# Altium footprint library HDR127P.PcbLib: 19 footprints (part 1 of 2)
Each footprint in its own frame and in the unit in brackets; x right, y up, seen from the top. Pads: shape width x height; smd on the part's side, far side on the other; paste and mask are expansions set on the pad; w line width, h text height; cw(c..) or ccw(c..) is an arc to the next point about the centre after c.
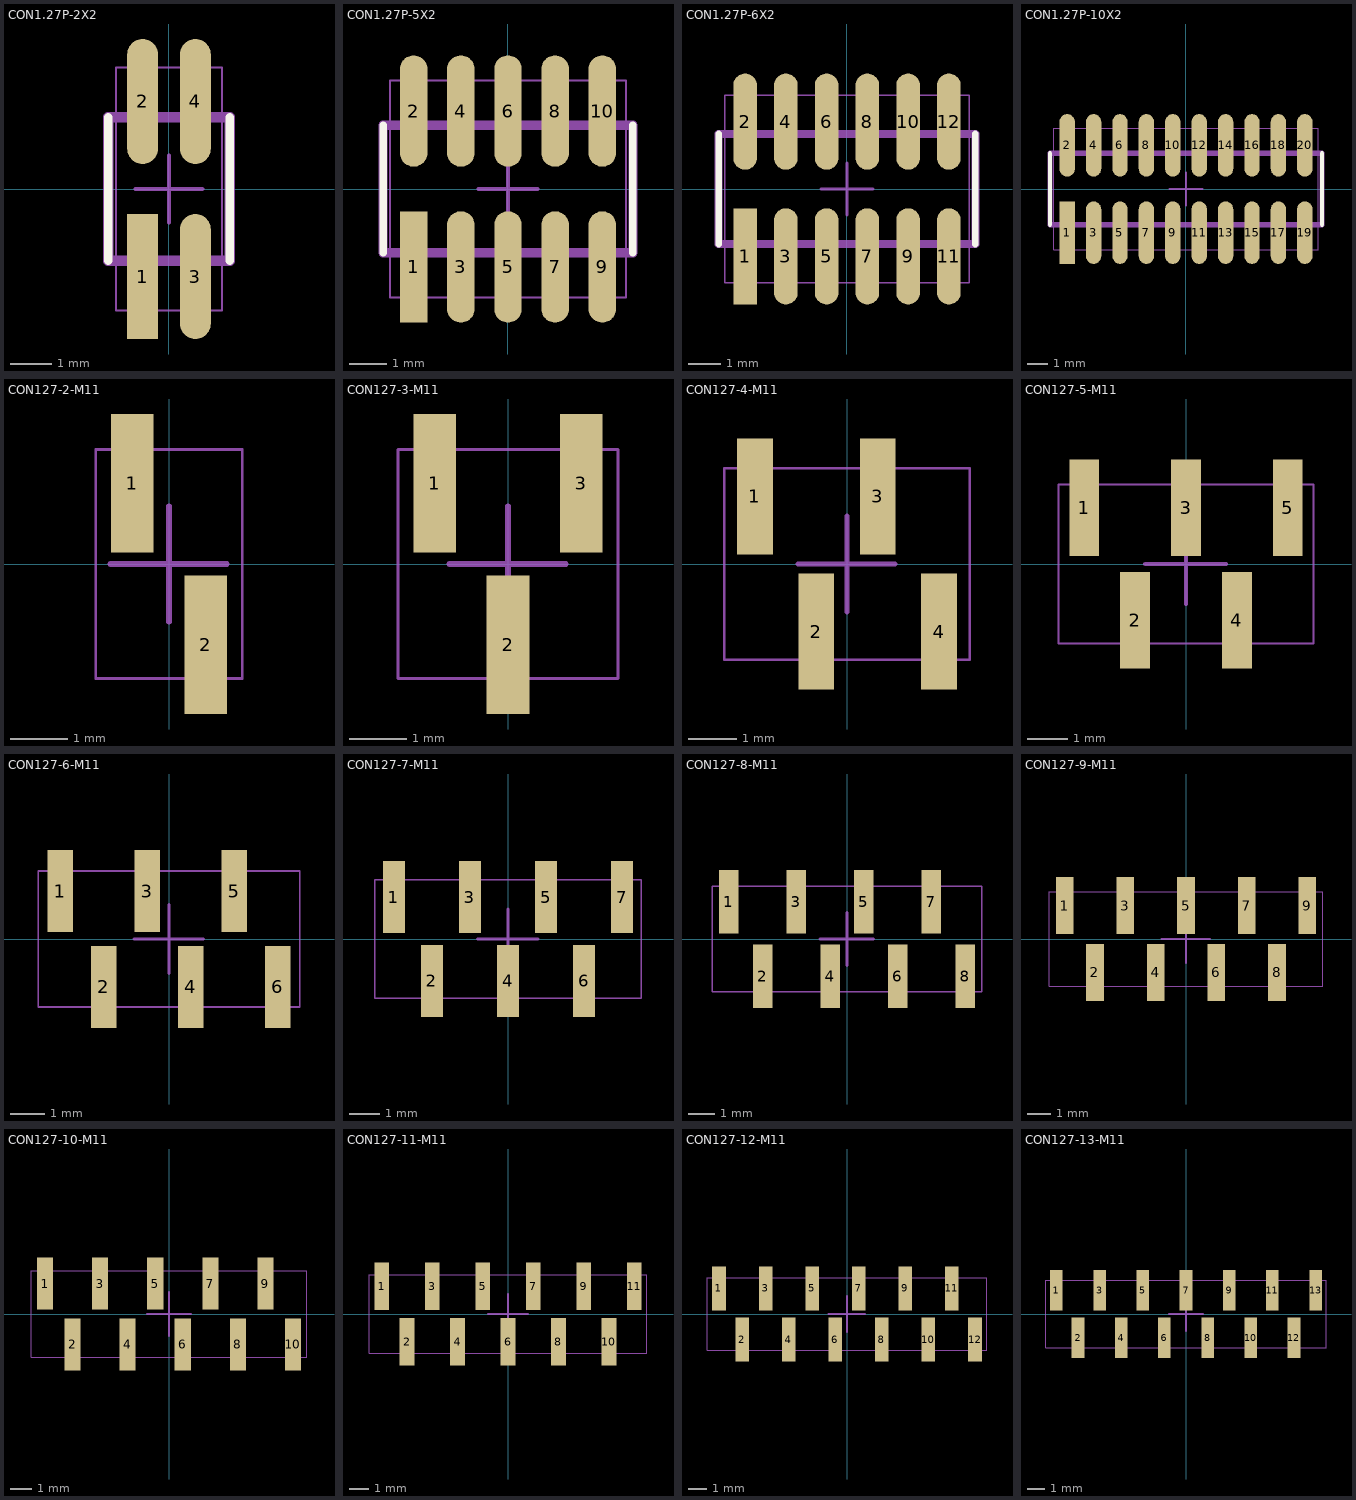
[diagram p0: the footprints below, top view; thin cyan lines are the x and y axes]

## CON1.27P-2X2 [mm] "贴片1.27X10X2脚排母"
height 3.4
pads (4):
  rect 0.74x3 smd: 1(-0.635,-2.1)
  oval 0.74x3 smd: 2(-0.635,2.1) 3(0.635,-2.1) 4(0.635,2.1)
Top Overlay:
  lines w0.2: -1.46,-1.72 -1.46,1.72 ; 1.46,-1.72 1.46,1.72
Mechanical 13:
  lines w0.05: -1.27,-2.921 -1.27,2.919 1.27,2.919 1.27,-2.921 -1.27,-2.921
Mechanical 15:
  lines w0.1: -0.8,0 0.8,0 ; 0,-0.8 0,0.8
  lines w0.25: -1.46,-1.72 1.46,-1.72 1.46,1.72 -1.46,1.72 -1.46,-1.72
3D body: height 4.9, standoff 0, extent -1.27,-2.92 1.27,2.92

## CON1.27P-5X2 [mm] "贴片1.27X10X2脚排母"
height 3.4
pads (10):
  rect 0.74x3 smd: 1(-2.54,-2.1)
  oval 0.74x3 smd: 2(-2.54,2.1) 3(-1.27,-2.1) 4(-1.27,2.1) 5(0,-2.1) 6(0,2.1) 7(1.27,-2.1) 8(1.27,2.1) 9(2.54,-2.1) 10(2.54,2.1)
Top Overlay:
  lines w0.2: -3.365,-1.72 -3.365,1.72 ; 3.365,-1.72 3.365,1.72
Mechanical 13:
  lines w0.05: -3.175,-2.921 -3.175,2.919 3.175,2.919 3.175,-2.921 -3.175,-2.921
Mechanical 15:
  lines w0.1: -0.8,0 0.8,0 ; 0,-0.8 0,0.8
  lines w0.25: -3.365,-1.72 3.365,-1.72 3.365,1.72 -3.365,1.72 -3.365,-1.72
3D body: height 4.9, standoff 0, extent -3.175,-2.92 3.175,2.92

## CON1.27P-6X2 [mm] "贴片1.27X10X2脚排母"
height 3.4
pads (12):
  rect 0.74x3 smd: 1(-3.175,-2.1)
  oval 0.74x3 smd: 2(-3.175,2.1) 3(-1.905,-2.1) 4(-1.905,2.1) 5(-0.635,-2.1) 6(-0.635,2.1) 7(0.635,-2.1) 8(0.635,2.1) 9(1.905,-2.1) 10(1.905,2.1) 11(3.175,-2.1) 12(3.175,2.1)
Top Overlay:
  lines w0.2: -4,-1.72 -4,1.72 ; 4,-1.72 4,1.72
Mechanical 13:
  lines w0.05: -3.81,-2.921 -3.81,2.919 3.81,2.919 3.81,-2.921 -3.81,-2.921
Mechanical 15:
  lines w0.1: -0.8,0 0.8,0 ; 0,-0.8 0,0.8
  lines w0.25: -4,-1.72 4,-1.72 4,1.72 -4,1.72 -4,-1.72
3D body: height 4.9, standoff 0, extent -3.81,-2.92 3.81,2.92

## CON1.27P-10X2 [mm] "贴片1.27X10X2脚排母"
height 3.4
pads (20):
  rect 0.74x3 smd: 1(-5.715,-2.1)
  oval 0.74x3 smd: 2(-5.715,2.1) 3(-4.445,-2.1) 4(-4.445,2.1) 5(-3.175,-2.1) 6(-3.175,2.1) 7(-1.905,-2.1) 8(-1.905,2.1) 9(-0.635,-2.1) 10(-0.635,2.1) 11(0.635,-2.1) 12(0.635,2.1) 13(1.905,-2.1) 14(1.905,2.1) 15(3.175,-2.1) 16(3.175,2.1) 17(4.445,-2.1) 18(4.445,2.1) 19(5.715,-2.1) 20(5.715,2.1)
Top Overlay:
  lines w0.2: -6.54,-1.72 -6.54,1.72 ; 6.54,-1.72 6.54,1.72
Mechanical 13:
  lines w0.05: -6.35,-2.921 6.35,-2.921 6.35,2.919 -6.35,2.919 -6.35,-2.921
Mechanical 15:
  lines w0.1: -0.8,0 0.8,0 ; 0,-0.8 0,0.8
  lines w0.25: -6.54,-1.72 -6.54,1.72 6.54,1.72 6.54,-1.72 -6.54,-1.72
3D body: height 4.9, standoff -0.9, extent -6.35,-2.921 6.35,2.919

## CON127-2-M11 [mm] "1.27mm脚距，排针。联益康电子"
height 5
pads (2):
  rect 0.74x2.4 smd: 1(-0.635,1.4) 2(0.635,-1.4)
Mechanical 13:
  lines w0.05: -1.27,-1.985 -1.27,1.985 1.27,1.985 1.27,-1.985 -1.27,-1.985
Mechanical 15:
  lines w0.1: -1.016,0 1,0 ; 0,-1 0,1
3D body: height 5.3, standoff 0.04, extent -1.27,-1.985 1.27,1.985

## CON127-3-M11 [mm] "1.27mm脚距，排针。联益康电子"
height 5
pads (3):
  rect 0.74x2.4 smd: 1(-1.27,1.4) 2(0,-1.4) 3(1.27,1.4)
Mechanical 13:
  lines w0.05: -1.905,-1.985 1.905,-1.985 1.905,1.985 -1.905,1.985 -1.905,-1.985
Mechanical 15:
  lines w0.1: -1.016,0 1,0 ; 0,-1 0,1
3D body: height 5.3, standoff 0.04, extent -1.905,-1.985 1.905,1.985

## CON127-4-M11 [mm] "1.27mm脚距，排针。联益康电子"
height 5
pads (4):
  rect 0.74x2.4 smd: 1(-1.905,1.4) 2(-0.635,-1.4) 3(0.635,1.4) 4(1.905,-1.4)
Mechanical 13:
  lines w0.05: -2.54,-1.985 2.54,-1.985 2.54,1.985 -2.54,1.985 -2.54,-1.985
Mechanical 15:
  lines w0.1: -1.016,0 1,0 ; 0,-1 0,1
3D body: height 5.3, standoff 0.04, extent -2.54,-1.985 2.54,1.985

## CON127-5-M11 [mm] "1.27mm脚距，排针。联益康电子"
height 5
pads (5):
  rect 0.74x2.4 smd: 1(-2.54,1.4) 2(-1.27,-1.4) 3(0,1.4) 4(1.27,-1.4) 5(2.54,1.4)
Mechanical 13:
  lines w0.05: -3.175,-1.985 -3.175,1.985 3.175,1.985 3.175,-1.985 -3.175,-1.985
Mechanical 15:
  lines w0.1: -1.016,0 1,0 ; 0,-1 0,1
3D body: height 5.3, standoff 0.04, extent -3.175,-1.985 3.175,1.985

## CON127-6-M11 [mm] "1.27mm脚距，排针。联益康电子"
height 5
pads (6):
  rect 0.74x2.4 smd: 1(-3.175,1.4) 2(-1.905,-1.4) 3(-0.635,1.4) 4(0.635,-1.4) 5(1.905,1.4) 6(3.175,-1.4)
Mechanical 13:
  lines w0.05: -3.81,-1.985 -3.81,1.985 3.81,1.985 3.81,-1.985 -3.81,-1.985
Mechanical 15:
  lines w0.1: -1.016,0 1,0 ; 0,-1 0,1
3D body: height 5.3, standoff 0.04, extent -3.81,-1.985 3.81,1.985

## CON127-7-M11 [mm] "1.27mm脚距，排针。联益康电子"
height 5
pads (7):
  rect 0.74x2.4 smd: 1(-3.81,1.4) 2(-2.54,-1.4) 3(-1.27,1.4) 4(0,-1.4) 5(1.27,1.4) 6(2.54,-1.4) 7(3.81,1.4)
Mechanical 13:
  lines w0.05: -4.445,-1.985 4.445,-1.985 4.445,1.985 -4.445,1.985 -4.445,-1.985
Mechanical 15:
  lines w0.1: -1.016,0 1,0 ; 0,-1 0,1
3D body: height 5.3, standoff 0.04, extent -4.445,-1.985 4.445,1.985

## CON127-8-M11 [mm] "1.27mm脚距，排针。联益康电子"
height 5
pads (8):
  rect 0.74x2.4 smd: 1(-4.445,1.4) 2(-3.175,-1.4) 3(-1.905,1.4) 4(-0.635,-1.4) 5(0.635,1.4) 6(1.905,-1.4) 7(3.175,1.4) 8(4.445,-1.4)
Mechanical 13:
  lines w0.05: -5.08,-1.985 5.08,-1.985 5.08,1.985 -5.08,1.985 -5.08,-1.985
Mechanical 15:
  lines w0.1: -1.016,0 1,0 ; 0,-1 0,1
3D body: height 5.3, standoff 0.04, extent -5.08,-1.985 5.08,1.985

## CON127-9-M11 [mm] "1.27mm脚距，排针。联益康电子"
height 5
pads (9):
  rect 0.74x2.4 smd: 1(-5.08,1.4) 2(-3.81,-1.4) 3(-2.54,1.4) 4(-1.27,-1.4) 5(0,1.4) 6(1.27,-1.4) 7(2.54,1.4) 8(3.81,-1.4) 9(5.08,1.4)
Mechanical 13:
  lines w0.05: -5.715,-1.985 5.715,-1.985 5.715,1.985 -5.715,1.985 -5.715,-1.985
Mechanical 15:
  lines w0.1: -1.016,0 1,0 ; 0,-1 0,1
3D body: height 5.3, standoff 0.04, extent -5.715,-1.985 5.715,1.985

## CON127-10-M11 [mm] "1.27mm脚距，排针。联益康电子"
height 5
pads (10):
  rect 0.74x2.4 smd: 1(-5.715,1.4) 2(-4.445,-1.4) 3(-3.175,1.4) 4(-1.905,-1.4) 5(-0.635,1.4) 6(0.635,-1.4) 7(1.905,1.4) 8(3.175,-1.4) 9(4.445,1.4) 10(5.715,-1.4)
Mechanical 13:
  lines w0.05: -6.35,-1.985 -6.35,1.985 6.35,1.985 6.35,-1.985 -6.35,-1.985
Mechanical 15:
  lines w0.1: -1.016,0 1,0 ; 0,-1 0,1
3D body: height 5.3, standoff 0.04, extent -6.35,-1.985 6.35,1.985

## CON127-11-M11 [mm] "1.27mm脚距，排针。联益康电子"
height 5
pads (11):
  rect 0.74x2.4 smd: 1(-6.35,1.4) 2(-5.08,-1.4) 3(-3.81,1.4) 4(-2.54,-1.4) 5(-1.27,1.4) 6(0,-1.4) 7(1.27,1.4) 8(2.54,-1.4) 9(3.81,1.4) 10(5.08,-1.4) 11(6.35,1.4)
Mechanical 13:
  lines w0.05: -6.985,-1.985 6.985,-1.985 6.985,1.985 -6.985,1.985 -6.985,-1.985
Mechanical 15:
  lines w0.1: -1.016,0 1,0 ; 0,-1 0,1
3D body: height 5.3, standoff 0.04, extent -6.985,-1.985 6.985,1.985

## CON127-12-M11 [mm] "1.27mm脚距，排针。联益康电子"
height 5
pads (12):
  rect 0.74x2.4 smd: 1(-6.985,1.4) 2(-5.715,-1.4) 3(-4.445,1.4) 4(-3.175,-1.4) 5(-1.905,1.4) 6(-0.635,-1.4) 7(0.635,1.4) 8(1.905,-1.4) 9(3.175,1.4) 10(4.445,-1.4) 11(5.715,1.4) 12(6.985,-1.4)
Mechanical 13:
  lines w0.05: -7.62,-1.985 -7.62,1.985 7.62,1.985 7.62,-1.985 -7.62,-1.985
Mechanical 15:
  lines w0.1: -1.016,0 1,0 ; 0,-1 0,1
3D body: height 5.3, standoff 0.04, extent -7.62,-1.985 7.62,1.985

## CON127-13-M11 [mm] "1.27mm脚距，排针。联益康电子"
height 5
pads (13):
  rect 0.74x2.4 smd: 1(-7.62,1.4) 2(-6.35,-1.4) 3(-5.08,1.4) 4(-3.81,-1.4) 5(-2.54,1.4) 6(-1.27,-1.4) 7(0,1.4) 8(1.27,-1.4) 9(2.54,1.4) 10(3.81,-1.4) 11(5.08,1.4) 12(6.35,-1.4) 13(7.62,1.4)
Mechanical 13:
  lines w0.05: -8.255,-1.985 8.255,-1.985 8.255,1.985 -8.255,1.985 -8.255,-1.985
Mechanical 15:
  lines w0.1: -1.016,0 1,0 ; 0,-1 0,1
3D body: height 5.3, standoff 0.04, extent -8.255,-1.985 8.255,1.985